# Altium footprint library ADP_SMT.PcbLib: 204 footprints (part 12 of 15)
Each footprint in its own frame and in the unit in brackets; x right, y up, seen from the top. Pads: shape width x height; smd on the part's side, far side on the other; paste and mask are expansions set on the pad; w line width, h text height; cw(c..) or ccw(c..) is an arc to the next point about the centre after c.
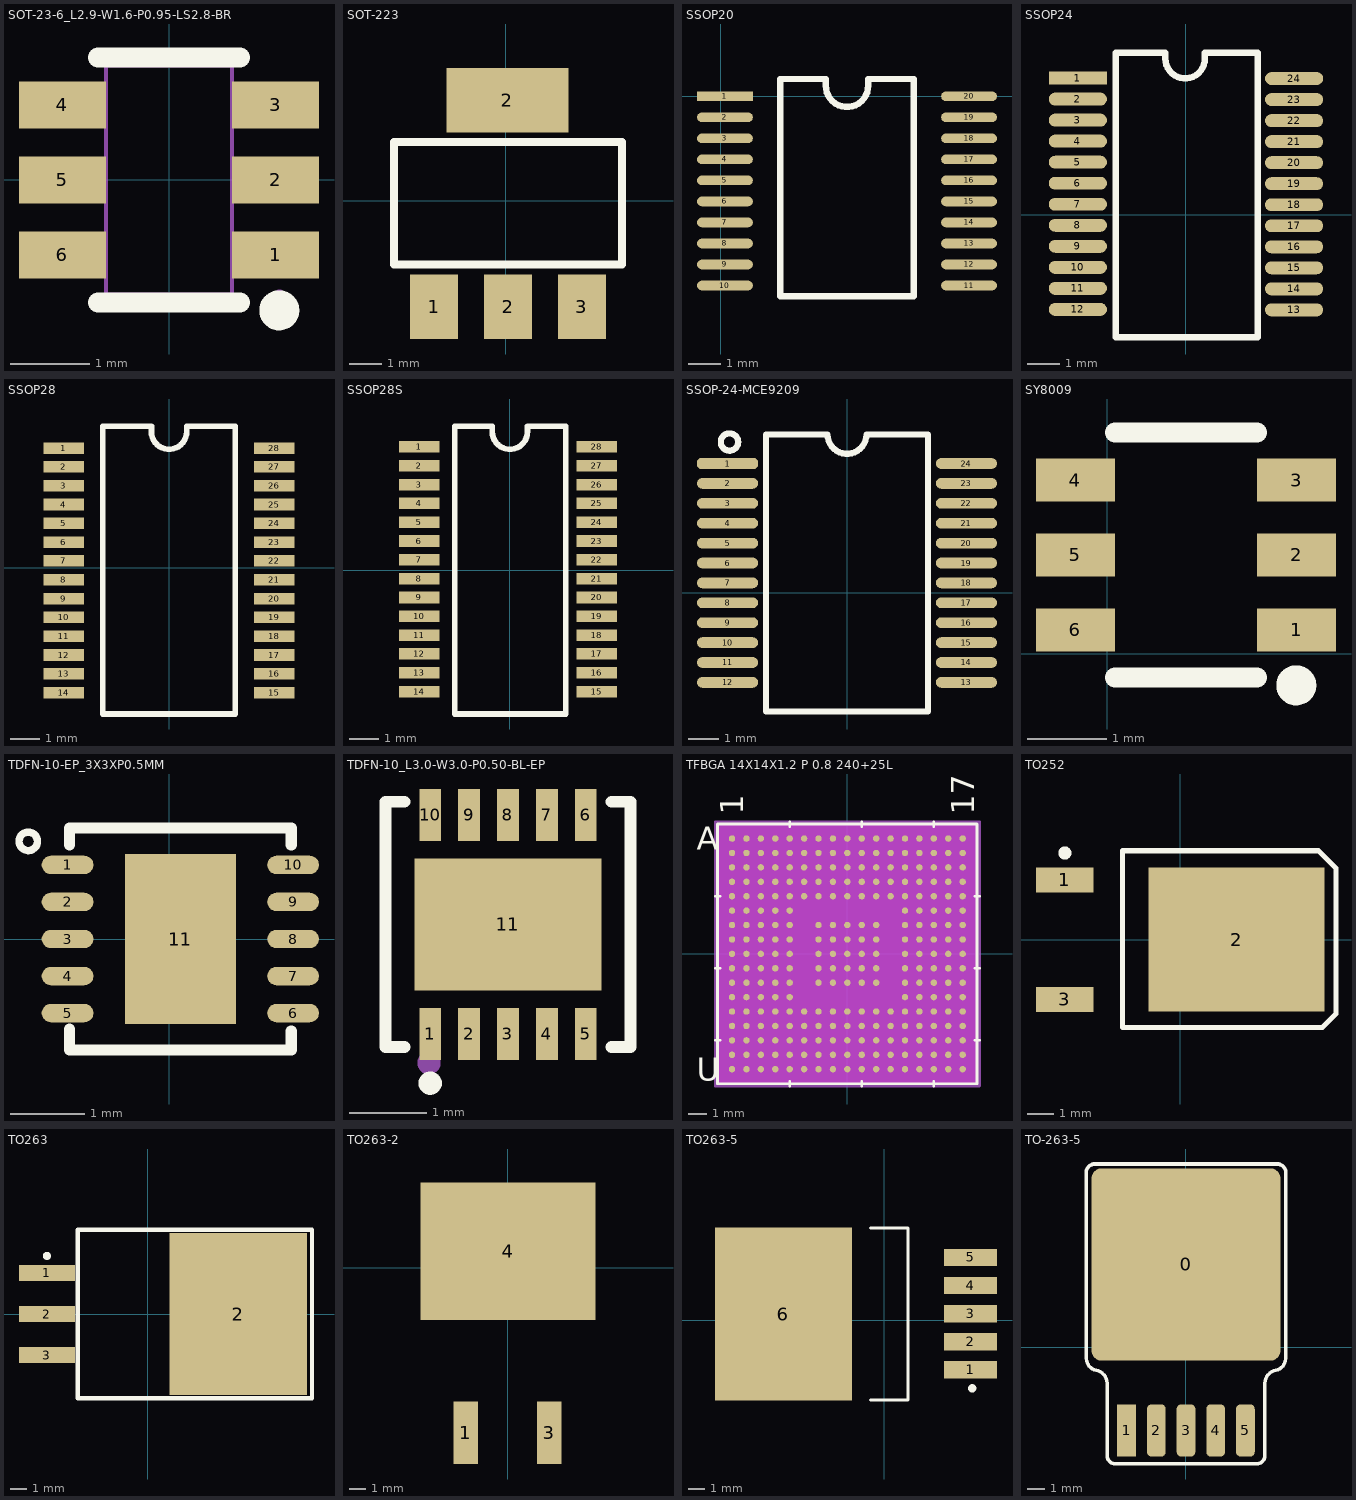
[diagram p11: the footprints below, top view; thin cyan lines are the x and y axes]

## SOT-23-6_L2.9-W1.6-P0.95-LS2.8-BR [mm]
pads (6):
  rect 1.1x0.6 smd paste+0 mask+0.051: 1(1.35,-0.95) 2(1.35,0) 3(1.35,0.95) 4(-1.35,0.95) 5(-1.35,0) 6(-1.35,-0.95)
Top Overlay:
  circle w0.254: c1.397,-1.651 r0.127
  lines w0.254: -0.9,-1.55 0.9,-1.55 ; -0.9,1.55 0.9,1.55
Mechanical 6:
  circle w0.2: c1.4,-0.95 r0.1
Mechanical 15:
  region: 1.46,-1.45 1.46,-1.425 1.425,-1.39 1.375,-1.39 1.34,-1.425 1.34,-1.45 1.34,-1.475 1.375,-1.51 1.425,-1.51 1.46,-1.475 1.46,-1.45
  region: -0.925,-1.165 -0.925,-0.735 -1.4,-0.735 -1.4,-1.165
  region: -0.925,-0.215 -0.925,0.215 -1.4,0.215 -1.4,-0.215
  region: -0.925,0.735 -0.925,1.165 -1.4,1.165 -1.4,0.735
  region: -0.935,0.735 -0.935,1.165 -0.79,1.165 -0.79,0.735
  region: 0.925,0.735 0.925,1.165 1.4,1.165 1.4,0.735
  region: 0.925,-0.215 0.925,0.215 1.4,0.215 1.4,-0.215
  region: 0.925,-1.165 0.925,-0.735 1.4,-0.735 1.4,-1.165
  region: -0.935,-0.215 -0.935,0.215 -0.79,0.215 -0.79,-0.215
  region: -0.935,-1.165 -0.935,-0.735 -0.79,-0.735 -0.79,-1.165
  region: 0.935,-0.735 0.935,-1.165 0.79,-1.165 0.79,-0.735
  region: 0.935,0.215 0.935,-0.215 0.79,-0.215 0.79,0.215
  region: 0.935,1.165 0.935,0.735 0.79,0.735 0.79,1.165
  lines w0.051: -0.8,-1.45 -0.8,1.45 0.8,1.45 0.8,-1.45 -0.8,-1.45

## SOT-223 [mil]
pads (4):
  rect 59x79 smd: 1(-88,-130) 2(2.55,-130) 3(93.1,-130)
  rect 150x79 smd: 2(1.88,123.54)
Top Overlay:
  lines w10: -137.45,-78 142.55,-78 142.55,72 -137.45,72 -137.45,-78
3D body "SOT-223_MP04A.STEP": height 66.93, standoff 0, extent -126.41,-138.72 129.5,135.3

## SSOP20 [mm]
pads (20):
  rect 1.727x0.3 smd: 1(0.127,0)
  oval 1.727x0.3 smd: 2(0.127,-0.65) 3(0.127,-1.3) 4(0.127,-1.95) 5(0.127,-2.6) 6(0.127,-3.25) 7(0.127,-3.9) 8(0.127,-4.55) 9(0.127,-5.2) 10(0.127,-5.85) 11(7.673,-5.85) 12(7.673,-5.2) 13(7.673,-4.55) 14(7.673,-3.9) 15(7.673,-3.25) 16(7.673,-2.6) 17(7.673,-1.95) 18(7.673,-1.3) 19(7.673,-0.65) 20(7.673,0)
Top Overlay:
  lines w0.2: 1.835,-6.175 1.835,0.533 3.245,0.533 3.245,0.325 ccw(c3.9,0.325) 4.555,0.325 4.555,0.533 5.965,0.533 5.965,-6.175 1.835,-6.175
3D body "SSOP-20.STEP": height 1.79, standoff -0.05, extent -0.013,-6.52 7.887,0.78

## SSOP24 [mm]
pads (24):
  rect 1.8x0.4 smd: 1(-3.326,4.229)
  oval 1.8x0.4 smd: 2(-3.326,3.579) 3(-3.326,2.93) 4(-3.326,2.28) 5(-3.326,1.63) 6(-3.326,0.981) 7(-3.326,0.331) 8(-3.326,-0.319) 9(-3.326,-0.968) 10(-3.326,-1.618) 11(-3.326,-2.267) 12(-3.326,-2.917) 13(3.353,-2.932) 14(3.353,-2.282) 15(3.353,-1.632) 16(3.353,-0.983) 17(3.353,-0.333) 18(3.353,0.316) 19(3.353,0.966) 20(3.353,1.616) 21(3.353,2.265) 22(3.353,2.915) 23(3.353,3.565) 24(3.354,4.214)
Top Overlay:
  lines w0.2: -2.159,-3.785 -2.159,5.01 -0.622,5.01 -0.622,4.827 ccw(c-0.013,4.827) 0.597,4.827 0.597,5.01 2.235,5.01 2.235,-3.785 -2.159,-3.785
3D body "SSOP 24 PIN_.step": height 1.78, standoff -0.21, extent -3.924,-3.654 3.976,4.976

## SSOP28 [mil]
height 93.7
pads (28):
  rect 55x15.75 smd: 1(-142.95,162.5) 2(-142.95,136.92) 3(-142.95,111.34) 4(-142.95,85.77) 5(-142.95,60.19) 6(-142.95,34.61) 7(-142.95,9.04) 8(-142.95,-16.54) 9(-142.95,-42.12) 10(-142.95,-67.69) 11(-142.95,-93.27) 12(-142.95,-118.85) 13(-142.95,-144.42) 14(-143,-170) 15(142.95,-170) 16(142.95,-144.42) 17(142.95,-118.85) 18(142.95,-93.27) 19(142.95,-67.69) 20(142.95,-42.12) 21(142.95,-16.54) 22(142.95,9.04) 23(142.95,34.62) 24(142.95,60.19) 25(142.95,85.77) 26(142.95,111.35) 27(142.95,136.92) 28(142.95,162.5)
Top Overlay:
  lines w7.87: -90,-199 90,-199 90,192 23.99,192 23.99,184.8 cw(c0,184.8) -23.99,184.8 -23.99,192 -90,192 -90,-199
3D body "TSSOP28.STEP": height 41.34, standoff 0, extent -133.91,-196.91 125.93,188.92

## SSOP28S [mil]
pads (28):
  rect 55x15.75 smd: 1(-122.95,167.5) 2(-122.95,141.92) 3(-122.95,116.34) 4(-122.95,90.77) 5(-122.95,65.19) 6(-122.95,39.61) 7(-122.95,14.04) 8(-122.95,-11.54) 9(-122.95,-37.12) 10(-122.95,-62.69) 11(-122.95,-88.27) 12(-122.95,-113.85) 13(-122.95,-139.42) 14(-123,-165) 15(117.95,-165) 16(117.95,-139.42) 17(117.95,-113.85) 18(117.95,-88.27) 19(117.95,-62.69) 20(117.95,-37.12) 21(117.95,-11.54) 22(117.95,14.04) 23(117.95,39.62) 24(117.95,65.19) 25(117.95,90.77) 26(117.95,116.35) 27(117.95,141.92) 28(117.95,167.5)
Top Overlay:
  lines w7.87: -75,-195.5 76,-195.5 76,195.5 23.99,195.5 23.99,188.3 cw(c0,188.3) -23.99,188.3 -23.99,195.5 -75,195.5 -75,-195.5
3D body "TSSOP28.STEP": height 41.34, standoff 0, extent -128.87,-192.5 130.97,193.32

## SSOP-24-MCE9209 [mm]
pads (24):
  oct 2x0.35 smd: 1(-3.9,4.225)
  oval 2x0.35 smd: 2(-3.9,3.575) 3(-3.9,2.925) 4(-3.9,2.275) 5(-3.9,1.625) 6(-3.9,0.975) 7(-3.9,0.325) 8(-3.9,-0.325) 9(-3.9,-0.975) 10(-3.9,-1.625) 11(-3.9,-2.275) 12(-3.9,-2.925) 13(3.9,-2.925) 14(3.9,-2.275) 15(3.9,-1.625) 16(3.9,-0.975) 17(3.9,-0.325) 18(3.9,0.325) 19(3.9,0.975) 20(3.9,1.625) 21(3.9,2.275) 22(3.9,2.925) 23(3.9,3.575) 24(3.9,4.225)
Top Overlay:
  circle w0.203: c-3.839,4.928 r0.283
  lines w0.203: -2.65,-3.875 -2.65,5.175 -0.635,5.175 ccw(c0,5.175) 0.635,5.175 2.65,5.175 2.65,-3.875 -2.65,-3.875
3D body "SSOP-24-MCE9209.STEP": height 1.54, standoff 0, extent -4.135,-3.574 3.881,4.826

## SY8009 [mm]
pads (6):
  rect 1x0.55 smd: 1(2.4,0.3) 2(2.4,1.25) 3(2.4,2.2) 4(-0.4,2.2) 5(-0.4,1.25) 6(-0.4,0.3)
Top Overlay:
  circle w0.254: c2.397,-0.401 r0.127
  lines w0.254: 0.1,-0.3 1.9,-0.3 ; 0.1,2.8 1.9,2.8
Mechanical 15:
  circle w0.2: c2.4,0.3 r0.1

## TDFN-10-EP_3X3XP0.5MM [mm]
pads (11):
  oval 0.7x0.25 smd: 1(-1.371,1.001) 2(-1.371,0.5) 3(-1.371,0) 4(-1.371,-0.5) 5(-1.371,-1.001) 6(1.677,-1.001) 7(1.677,-0.5) 8(1.677,0) 9(1.677,0.5) 10(1.677,1.001)
  rect 1.5x2.3 smd: 11(0.153,0)
Top Overlay:
  lines w0.1: -1.777,1.318 cw(c-1.902,1.32) -1.777,1.321
  lines w0.15: -1.345,-1.219 -1.345,-1.499 1.652,-1.499 1.652,-1.245 ; -1.345,1.27 -1.345,1.499 1.652,1.499 1.652,1.27

## TDFN-10_L3.0-W3.0-P0.50-BL-EP [mm]
pads (11):
  rect 0.28x0.665 smd: 1(458.156,-414.363) 2(458.656,-414.363) 3(459.156,-414.363) 4(459.656,-414.363) 5(460.156,-414.363) 6(460.156,-411.548) 7(459.656,-411.548) 8(459.156,-411.548) 9(458.656,-411.548) 10(458.156,-411.548)
  rect 2.4x1.7 smd: 11(459.156,-412.955)
Top Overlay:
  circle w0.15: c458.156,-414.996 r0.075
  lines w0.152: 457.825,-414.532 457.58,-414.532 457.58,-411.379 457.825,-411.379 ; 460.486,-414.532 460.732,-414.532 460.732,-411.379 460.486,-411.379
Mechanical 15:
  circle w0.15: c458.14,-414.733 r0.075

## TFBGA 14X14X1.2 P 0.8 240+25L [mil]
pads (265):
  round 14 smd paste+0 mask+0: A1(-251.97,251.97) A2(-220.47,251.97) A3(-188.98,251.97) A4(-157.48,251.97) A5(-125.98,251.97) A6(-94.49,251.97) A7(-62.99,251.97) A8(-31.5,251.97) A9(0,251.97) A10(31.5,251.97) A11(62.99,251.97) A12(94.49,251.97) A13(125.98,251.97) A14(157.48,251.97) A15(188.98,251.97) A16(220.47,251.97) A17(251.97,251.97) B1(-251.97,220.47) B2(-220.47,220.47) B3(-188.98,220.47) B4(-157.48,220.47) B5(-125.98,220.47) B6(-94.49,220.47) B7(-62.99,220.47) B8(-31.5,220.47) B9(0,220.47) B10(31.5,220.47) B11(62.99,220.47) B12(94.49,220.47) B13(125.98,220.47) B14(157.48,220.47) B15(188.98,220.47) B16(220.47,220.47) B17(251.97,220.47) C1(-251.97,188.98) C2(-220.47,188.98) C3(-188.98,188.98) C4(-157.48,188.98) C5(-125.98,188.98) C6(-94.49,188.98) C7(-62.99,188.98) C8(-31.5,188.98) C9(0,188.98) C10(31.5,188.98) C11(62.99,188.98) C12(94.49,188.98) C13(125.98,188.98) C14(157.48,188.98) C15(188.98,188.98) C16(220.47,188.98) C17(251.97,188.98) D1(-251.97,157.48) D2(-220.47,157.48) D3(-188.98,157.48) D4(-157.48,157.48) D5(-125.98,157.48) D6(-94.49,157.48) D7(-62.99,157.48) D8(-31.5,157.48) D9(0,157.48) D10(31.5,157.48) D11(62.99,157.48) D12(94.49,157.48) D13(125.98,157.48) D14(157.48,157.48) D15(188.98,157.48) D16(220.47,157.48) D17(251.97,157.48) E1(-251.97,125.98) E2(-220.47,125.98) E3(-188.98,125.98) E4(-157.48,125.98) E5(-125.98,125.98) E6(-94.49,125.98) E7(-62.99,125.98) E8(-31.5,125.98) E9(0,125.98) E10(31.5,125.98) E11(62.99,125.98) E12(94.49,125.98) E13(125.98,125.98) E14(157.48,125.98) E15(188.98,125.98) E16(220.47,125.98) E17(251.97,125.98) F1(-251.97,94.49) F2(-220.47,94.49) F3(-188.98,94.49) F4(-157.48,94.49) F5(-125.98,94.49) F13(125.98,94.49) F14(157.48,94.49) F15(188.98,94.49) F16(220.47,94.49) F17(251.97,94.49) G1(-251.97,62.99) G2(-220.47,62.99) G3(-188.98,62.99) G4(-157.48,62.99) G5(-125.98,62.99) G7(-62.99,62.99) G8(-31.5,62.99) G9(0,62.99) G10(31.5,62.99) G11(62.99,62.99) G13(125.98,62.99) G14(157.48,62.99) G15(188.98,62.99) G16(220.47,62.99) G17(251.97,62.99) H1(-251.97,31.5) H2(-220.47,31.5) H3(-188.98,31.5) H4(-157.48,31.5) H5(-125.98,31.5) H7(-62.99,31.5) H8(-31.5,31.5) H9(0,31.5) H10(31.5,31.5) H11(62.99,31.5) H13(125.98,31.5) H14(157.48,31.5) H15(188.98,31.5) H16(220.47,31.5) H17(251.97,31.5) J1(-251.97,0) J2(-220.47,0) J3(-188.98,0) J4(-157.48,0) J5(-125.98,0) J7(-62.99,0) J8(-31.5,0) J9(0,0) J10(31.5,0) J11(62.99,0) J13(125.98,0) J14(157.48,0) J15(188.98,0) J16(220.47,0) J17(251.97,0) K1(-251.97,-31.5) K2(-220.47,-31.5) K3(-188.98,-31.5) K4(-157.48,-31.5) K5(-125.98,-31.5) K7(-62.99,-31.5) K8(-31.5,-31.5) K9(0,-31.5) K10(31.5,-31.5) K11(62.99,-31.5) K13(125.98,-31.5) K14(157.48,-31.5) K15(188.98,-31.5) K16(220.47,-31.5) K17(251.97,-31.5) L1(-251.97,-62.99) L2(-220.47,-62.99) L3(-188.98,-62.99) L4(-157.48,-62.99) L5(-125.98,-62.99) L7(-62.99,-62.99) L8(-31.5,-62.99) L9(0,-62.99) L10(31.5,-62.99) L11(62.99,-62.99) L13(125.98,-62.99) L14(157.48,-62.99) L15(188.98,-62.99) L16(220.47,-62.99) L17(251.97,-62.99) M1(-251.97,-94.49) M2(-220.47,-94.49) M3(-188.98,-94.49) M4(-157.48,-94.49) M5(-125.98,-94.49) M13(125.98,-94.49) M14(157.48,-94.49) M15(188.98,-94.49) M16(220.47,-94.49) M17(251.97,-94.49) N1(-251.97,-125.98) N2(-220.47,-125.98) N3(-188.98,-125.98) N4(-157.48,-125.98) N5(-125.98,-125.98) N6(-94.49,-125.98) N7(-62.99,-125.98) N8(-31.5,-125.98) N9(0,-125.98) N10(31.5,-125.98) N11(62.99,-125.98) N12(94.49,-125.98) N13(125.98,-125.98) N14(157.48,-125.98) N15(188.98,-125.98) N16(220.47,-125.98) N17(251.97,-125.98) P1(-251.97,-157.48) P2(-220.47,-157.48) P3(-188.98,-157.48) P4(-157.48,-157.48) P5(-125.98,-157.48) P6(-94.49,-157.48) P7(-62.99,-157.48) P8(-31.5,-157.48) P9(0,-157.48) P10(31.5,-157.48) P11(62.99,-157.48) P12(94.49,-157.48) P13(125.98,-157.48) P14(157.48,-157.48) P15(188.98,-157.48) P16(220.47,-157.48) P17(251.97,-157.48) R1(-251.97,-188.98) R2(-220.47,-188.98) R3(-188.98,-188.98) R4(-157.48,-188.98) R5(-125.98,-188.98) R6(-94.49,-188.98) R7(-62.99,-188.98) R8(-31.5,-188.98) R9(0,-188.98) R10(31.5,-188.98) R11(62.99,-188.98) R12(94.49,-188.98) R13(125.98,-188.98) R14(157.48,-188.98) R15(188.98,-188.98) R16(220.47,-188.98) R17(251.97,-188.98) T1(-251.97,-220.47) T2(-220.47,-220.47) T3(-188.98,-220.47) T4(-157.48,-220.47) T5(-125.98,-220.47) T6(-94.49,-220.47) T7(-62.99,-220.47) T8(-31.5,-220.47) T9(0,-220.47) T10(31.5,-220.47) T11(62.99,-220.47) T12(94.49,-220.47) T13(125.98,-220.47) T14(157.48,-220.47) T15(188.98,-220.47) T16(220.47,-220.47) T17(251.97,-220.47) U1(-251.97,-251.97) U2(-220.47,-251.97) U3(-188.98,-251.97) U4(-157.48,-251.97) U5(-125.98,-251.97) U6(-94.49,-251.97) U7(-62.99,-251.97) U8(-31.5,-251.97) U9(0,-251.97) U10(31.5,-251.97) U11(62.99,-251.97) U12(94.49,-251.97) U13(125.98,-251.97) U14(157.48,-251.97) U15(188.98,-251.97) U16(220.47,-251.97) U17(251.97,-251.97)
Top Overlay:
  lines w6: -288.5,-188.98 -278.5,-188.98 ; -288.5,-31.5 -278.5,-31.5 ; -288.5,125.98 -278.5,125.98 ; -125.98,-288.5 -125.98,-278.5 ; -125.98,278.5 -125.98,288.5 ; 31.5,-288.5 31.5,-278.5 ; 31.5,278.5 31.5,288.5 ; 188.98,-288.5 188.98,-278.5 ; 188.98,278.5 188.98,288.5 ; 278.5,-188.98 288.5,-188.98 ; 278.5,-31.5 288.5,-31.5 ; 278.5,125.98 288.5,125.98 ; -283.5,-283.5 283.5,-283.5 283.5,283.5 -283.5,283.5 -283.5,-283.5
  text "A" at -328.5,226.97 h50
  text "U" at -328.5,-276.97 h50
  text "1" at -226.97,303.5 h50
  text "17" at 276.97,303.5 h50
Bottom Overlay:
  text "A" at -303.5,226.97 h50
  text "U" at -303.5,-276.97 h50
  text "1" at -276.97,303.5 h50
  text "17" at 226.97,303.5 h50
Keep-Out Layer:
  region: -285.22,-285.22 -285.22,285.22 285.22,285.22 285.22,-285.22
Mechanical 13:
  lines w1: -278.5,262.75 -262.75,278.5 ; -278.5,-278.5 278.5,-278.5 278.5,278.5 -278.5,278.5 -278.5,-278.5
  text "A" at -328.5,226.97 h50
  text "U" at -328.5,-276.97 h50
  text "1" at -226.97,303.5 h50
  text "17" at 276.97,303.5 h50
Mechanical 15:
  region: 288.5,-288.5 -288.5,-288.5 -288.5,288.5 288.5,288.5
  lines w6: -288.5,-288.5 -288.5,288.5 288.5,288.5 288.5,-288.5 -288.5,-288.5
3D body "TFBGA14X14X12P08240+25L.step": height 43.11, standoff 0.01, extent -278.5,-278.5 278.5,278.5

## TO252 [mm] "D-PAK  / SOT-428"
height 2.38
pads (3):
  rect 2.2x0.95 smd: 1(-4.4,2.28) 3(-4.4,-2.28)
  rect 6.7x5.5 smd: 2(2.15,0)
Top Overlay:
  circle w0.25: c-4.4,3.305 r0.125
  lines w0.1: -2.2,-3.35 -2.2,3.35
  lines w0.2: -2.2,-3.35 5.418,-3.35 5.944,-2.824 5.944,2.725 5.278,3.391 -2.2,3.391 -2.2,-3.35
3D body "D-PAK.STEP": height 2.31, standoff 0, extent -4.475,-3.3 4.775,3.3

## TO263 [mm] "D2PAK936"
height 4.5
pads (4):
  rect 3.45x1 smd: 1(-6.225,2.54) 2(-6.225,0) 3(-6.225,-2.54)
  rect 8.5x10 smd: 2(5.588,0)
Top Overlay:
  circle w0.25: c-6.225,3.59 r0.125
  lines w0.254: -4.318,-5.207 10.16,-5.207 10.16,5.207 -4.318,5.207 -4.318,-5.207
3D body "SW3dPS-TO263-3.STEP": height 4.88, standoff 0.08, extent -6.819,-5.054 8.851,4.946

## TO263-2 [mil]
pads (3):
  rect 59.06x150 smd: 1(-101,-397) 3(100,-397)
  rect 420x330 smd: 4(1,40)
3D body "User Library-DPAK.step": height 193.9, standoff -3.66, extent -200,-441.47 200,159.47

## TO263-5 [mm]
pads (6):
  rect 3.2x1.05 smd: 1(5.207,-2.997) 2(5.207,-1.297) 3(5.207,0.403) 4(5.207,2.103) 5(5.207,3.803)
  rect 8.3x10.45 smd: 6(-6.117,0.381)
Top Overlay:
  circle w0.25: c5.309,-4.115 r0.125
  lines w0.2: -0.83,-4.819 1.42,-4.819 1.42,5.581 -0.83,5.581
3D body "TO263-5.STEP": height 4.78, standoff -0.02, extent -9.537,-4.644 6.133,5.356

## TO-263-5 [mm]
pads (6):
  rrect10% 10.8x11 smd: 0(0,4.75)
  rect 1.07x3 smd: 1(-3.4,-4.75)
  rrect50% 1.07x3 smd: 2(-1.7,-4.75) 3(0,-4.75) 4(1.7,-4.75) 5(3.4,-4.75)
Top Overlay:
  lines w0.2: -4.512,-6.122 ccw(c-4.028,-6.181) -4.125,-6.659 ; 4.125,-6.659 ccw(c4.028,-6.181) 4.512,-6.122
  lines w0.203: -5.7,10.05 -5.7,-0.53 ccw(c-5.005,-0.615) -5.145,-1.301 cw(c-5.306,-2.084) -4.512,-2.181 -4.512,-6.122 ; -5.7,10.109 cw(c-5.222,10.011) -5.299,10.493 ; -5.3,10.5 5.3,10.5 ; -4.125,-6.659 4.125,-6.659 ; 4.512,-6.122 4.512,-2.181 cw(c5.306,-2.084) 5.145,-1.301 ccw(c5.005,-0.615) 5.7,-0.53 5.7,10.05 ; 5.299,10.493 cw(c5.222,10.011) 5.7,10.109
3D body "SW3dPS-LTC DD-PAK.STEP": height 4.48, standoff 0, extent -5.137,-4.801 5.087,9.55